# Altium footprint library PCB_CONNECTORS.PcbLib: 676 footprints (part 2 of 43)
Each footprint in its own frame and in the unit in brackets; x right, y up, seen from the top. Pads: shape width x height; smd on the part's side, far side on the other; paste and mask are expansions set on the pad; w line width, h text height; cw(c..) or ccw(c..) is an arc to the next point about the centre after c.
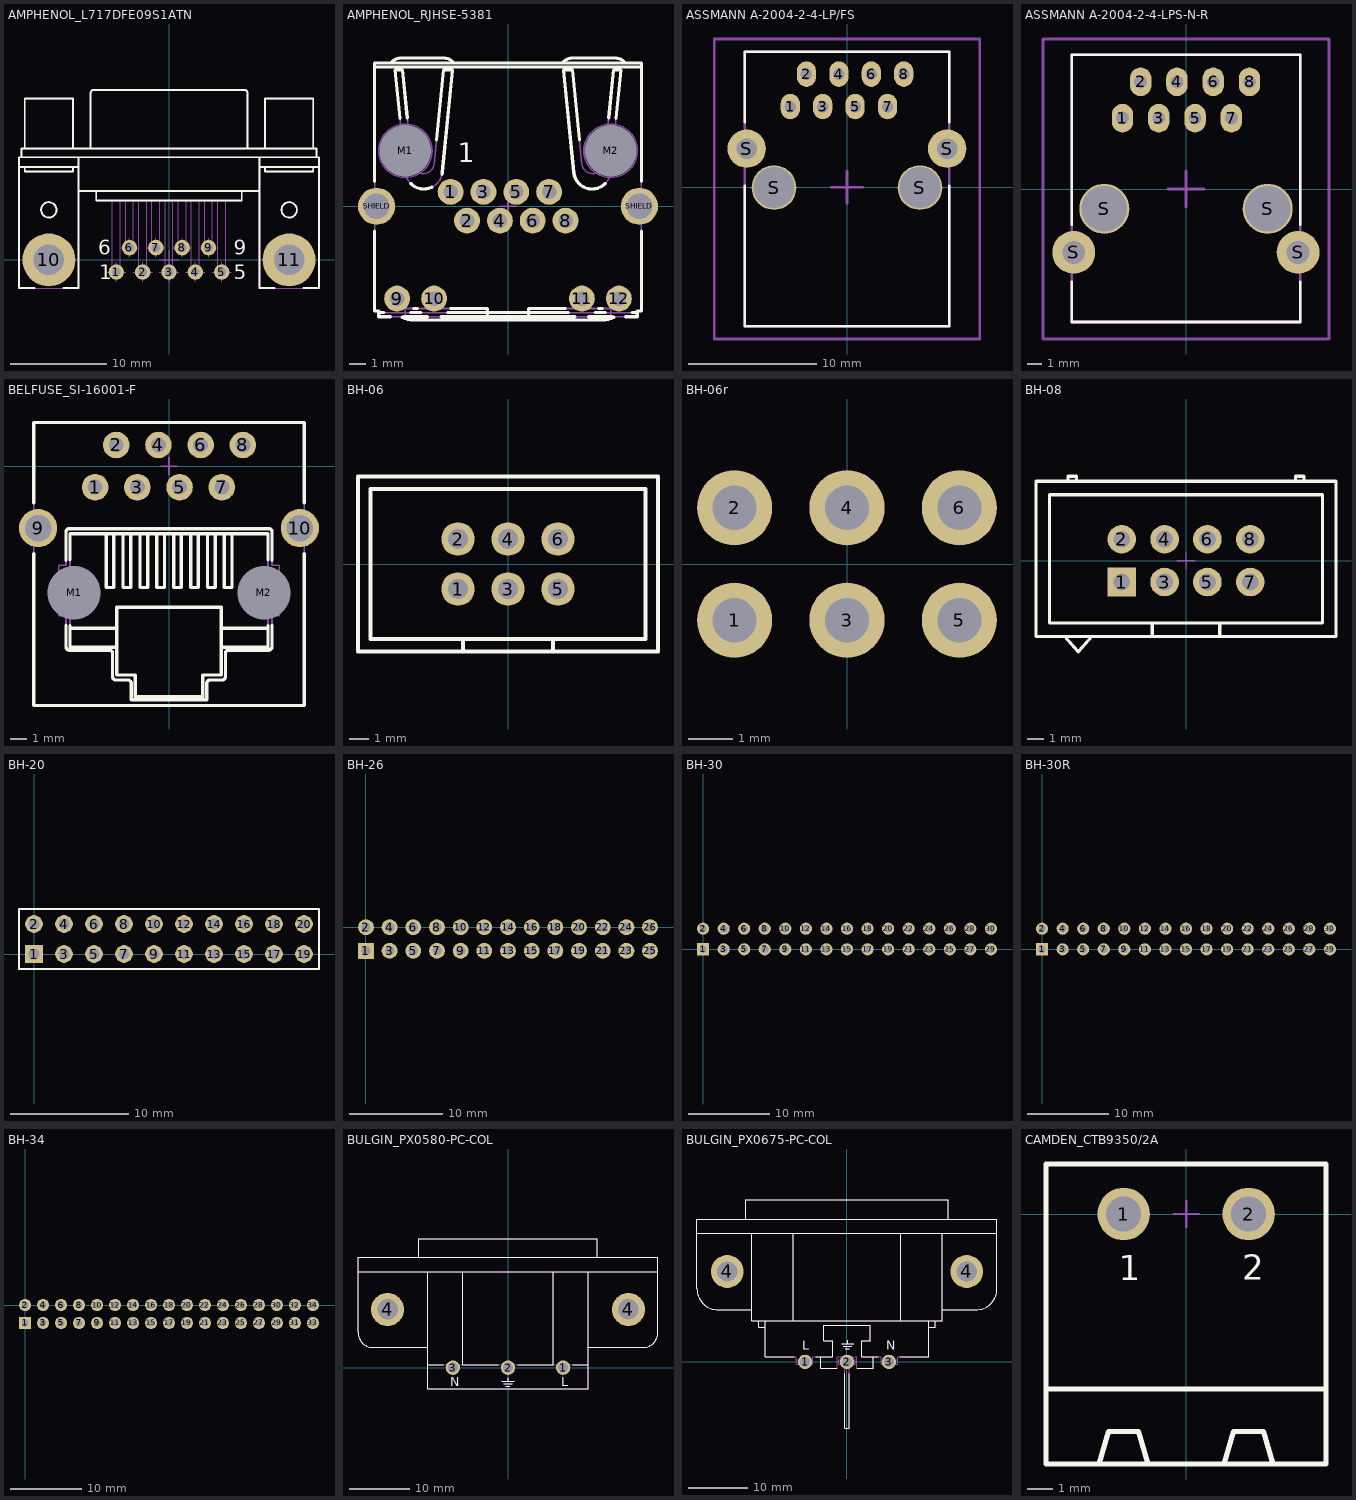
[diagram p1: the footprints below, top view; thin cyan lines are the x and y axes]

## AMPHENOL_L717DFE09S1ATN [mm] "Right Angled D-Sub 9 Female Contacts with Metal Bracket and Front Female Screwlock (UNC4-40)"
height 13.4
pads (11):
  round 1.6 hole 0.9: 1(-5.48,-1.27) 2(-2.74,-1.27) 3(0,-1.27) 4(2.74,-1.27) 5(5.48,-1.27) 6(-4.11,1.27) 7(-1.37,1.27) 8(1.37,1.27) 9(4.11,1.27)
  round 5.5 hole 3.2: 10(-12.495,0) 11(12.495,0)
Top Overlay:
  circle w0.2: c-12.5,5.2 r0.8
  circle w0.2: c12.5,5.2 r0.8
  lines w0.2: -15.35,10.67 -15.35,11.57 15.35,11.57 15.35,10.67 ; -15,9.67 -15,9.17 -10,9.17 -10,9.67 ; -15,11.57 -15,16.77 -10,16.77 -10,11.57 ; -14,-2.93 -15.6,-2.93 -15.6,10.67 15.6,10.67 15.6,-2.93 14,-2.93 ; -11,-2.93 -9.4,-2.93 -9.4,10.67 ; -9.539,9.67 -15.6,9.67 -9.4,9.67 ; -9.4,7.17 9.4,7.17 ; -8.142,11.57 -8.142,17.37 cw(c-7.842,17.37) -7.842,17.67 7.861,17.67 cw(c7.861,17.37) 8.161,17.37 8.161,11.57 ; -7.57,7.17 -7.57,6.17 7.57,6.17 7.57,7.17 ; 9.4,9.67 15.6,9.67 ; 9.4,10.67 9.4,-2.93 11,-2.93 ; 10,9.67 10,9.17 15,9.17 15,9.67 ; 10,11.57 10,16.77 15,16.77 15,11.57
  text "9" at 6.731,0.508 h1.5
  text "1" at -7.239,-2.032 h1.5
  text "5" at 6.731,-2.032 h1.5
  text "6" at -7.366,0.508 h1.5
Mechanical 8:
  lines w0.1: -13.5,0 -12.5,0 ; -12.5,-1 -12.5,0 ; -12.5,1 -12.5,0 ; -11.5,0 -12.5,0 ; -6.48,-1.27 -5.48,-1.27 ; -5.48,-2.27 -5.48,-1.27 ; -5.48,-0.27 -5.48,-1.27 ; -5.11,1.27 -4.11,1.27 ; -4.48,-1.27 -5.48,-1.27 ; -4.11,0.27 -4.11,1.27 ; -4.11,2.27 -4.11,1.27 ; -3.74,-1.27 -2.74,-1.27 ; -3.11,1.27 -4.11,1.27 ; -2.74,-2.27 -2.74,-1.27 ; -2.74,-0.27 -2.74,-1.27 ; -2.37,1.27 -1.37,1.27 ; -1.74,-1.27 -2.74,-1.27 ; -1.37,0.27 -1.37,1.27 ; -1.37,2.27 -1.37,1.27 ; -1,-1.27 0,-1.27 ; -1,0 0,0 ; -0.37,1.27 -1.37,1.27 ; 0,-2.27 0,-1.27 ; 0,-1 0,0 ; 0,-0.27 0,-1.27 ; 0,1 0,0 ; 0.37,1.27 1.37,1.27 ; 1,-1.27 0,-1.27 ; 1,0 0,0 ; 1.37,0.27 1.37,1.27 ; 1.37,2.27 1.37,1.27 ; 1.74,-1.27 2.74,-1.27 ; 2.37,1.27 1.37,1.27 ; 2.74,-2.27 2.74,-1.27 ; 2.74,-0.27 2.74,-1.27 ; 3.11,1.27 4.11,1.27 ; 3.74,-1.27 2.74,-1.27 ; 4.11,0.27 4.11,1.27 ; 4.11,2.27 4.11,1.27 ; 4.48,-1.27 5.48,-1.27 ; 5.11,1.27 4.11,1.27 ; 5.48,-2.27 5.48,-1.27 ; 5.48,-0.27 5.48,-1.27 ; 6.48,-1.27 5.48,-1.27 ; 11.5,0 12.5,0 ; 12.5,-1 12.5,0 ; 12.5,1 12.5,0 ; 13.5,0 12.5,0
Mechanical 14:
  circle w0.1: c-12.5,0 r1.6
  circle w0.1: c-12.5,5.2 r0.8
  circle w0.1: c12.5,5.2 r0.8
  circle w0.1: c12.5,0 r1.6
  lines w0.1: -15.35,10.67 -15.35,11.57 15.35,11.57 15.35,10.67 ; -15,9.67 -15,9.17 -10,9.17 -10,9.67 ; -15,11.57 -15,16.77 -10,16.77 -10,11.57 ; -9.539,9.67 -15.6,9.67 -9.4,9.67 ; -9.4,7.17 9.4,7.17 ; -9.4,10.67 -9.4,-2.93 -15.6,-2.93 -15.6,10.67 15.6,10.67 15.6,-2.93 9.4,-2.93 9.4,10.67 ; -8.142,11.57 -8.142,17.37 cw(c-7.842,17.37) -7.842,17.67 7.861,17.67 cw(c7.861,17.37) 8.161,17.37 8.161,11.57 ; -7.57,7.17 -7.57,6.17 7.57,6.17 7.57,7.17 ; -5.88,6.17 -5.88,-1.27 ccw(c-5.48,-1.27) -5.08,-1.27 -5.08,6.17 ; -4.51,6.17 -4.51,1.27 ccw(c-4.11,1.27) -3.71,1.27 -3.71,6.17 ; -3.14,6.17 -3.14,-1.27 ccw(c-2.74,-1.27) -2.34,-1.27 -2.34,6.17 ; -1.77,6.17 -1.77,1.27 ccw(c-1.37,1.27) -0.97,1.27 -0.97,6.17 ; -0.4,6.17 -0.4,-1.27 ccw(c0,-1.27) 0.4,-1.27 0.4,6.17 ; 0.97,6.17 0.97,1.27 ccw(c1.37,1.27) 1.77,1.27 1.77,6.17 ; 2.34,6.17 2.34,-1.27 ccw(c2.74,-1.27) 3.14,-1.27 3.14,6.17 ; 3.71,6.17 3.71,1.27 ccw(c4.11,1.27) 4.51,1.27 4.51,6.17 ; 5.08,6.17 5.08,-1.27 ccw(c5.48,-1.27) 5.88,-1.27 5.88,6.17 ; 9.4,9.67 15.6,9.67 ; 10,9.67 10,9.17 15,9.17 15,9.67 ; 10,11.57 10,16.77 15,16.77 15,11.57
3D body "AMPHENOL_L717DFE09S1ATN.stp": height 13.45, standoff -3.95, extent -15.6,-2.93 15.6,17.67

## AMPHENOL_RJHSE-5381 [mm] "1 Port, 8 Positions, CAT5 RJ45 Modular Connector With Yellow And Green LEDs"
height 13.46
pads (16):
  round 1.6 hole 0.9: 1(-3.554,0.886) 2(-2.538,-0.894) 3(-1.522,0.886) 4(-0.506,-0.894) 5(0.51,0.886) 6(1.526,-0.894) 7(2.542,0.886) 8(3.558,-0.894) 9(-6.862,-5.714) 10(-4.572,-5.714) 11(4.568,-5.714) 12(6.858,-5.714)
  round 1 hole 3.2 unplated mask+1.1: M1(-6.352,3.426) M2(6.348,3.426)
  round 2.3 hole 1.6: SHIELD(-8.132,-0.004) SHIELD(8.128,-0.004)
Top Overlay:
  lines w0.2: -8.257,-1.549 -8.257,-6.478 -8.003,-6.478 -8.003,-6.834 -7.293,-6.834 ; -8.257,1.541 -8.257,8.863 8.253,8.863 8.253,1.541 ; -8.257,8.609 8.253,8.609 ; -8.003,-6.58 -7.693,-6.58 ; -7.242,8.863 cw(c-6.621,8.379) -6.621,9.166 -3.979,9.166 cw(c-3.979,8.379) -3.358,8.863 ; -6.688,5.449 -6.987,8.432 -6.53,8.432 -6.233,5.473 ; -6.54,-6.87 ccw(c-5.844,-5.507) -5.844,-7.037 5.84,-7.037 ccw(c5.84,-5.507) 6.536,-6.87 ; -6.431,-6.834 -5.003,-6.834 ; -6.031,-6.58 -5.403,-6.58 ; -6.022,1.403 ccw(c-5.209,2.214) -4.719,1.176 ; -5.83,-6.326 -5.604,-6.326 ; -4.422,4.118 -3.99,8.432 -3.431,8.432 -4.066,2.1 cw(c-5.209,2.214) -4.089,1.961 ; -4.141,-6.834 4.137,-6.834 ; -3.741,-6.58 3.737,-6.58 ; -3.54,-6.326 -1.272,-6.326 -1.272,-6.834 ; 1.268,-6.834 1.268,-6.326 3.536,-6.326 ; 3.366,8.863 cw(c3.986,8.379) 3.986,9.166 6.628,9.166 cw(c6.628,8.379) 7.249,8.863 ; 4.418,4.118 3.986,8.432 3.427,8.432 4.062,2.1 ccw(c5.205,2.214) 6.018,1.403 ; 4.999,-6.834 6.427,-6.834 ; 5.399,-6.58 6.027,-6.58 ; 5.6,-6.326 5.826,-6.326 ; 6.229,5.473 6.526,8.432 6.983,8.432 6.684,5.449 ; 7.289,-6.834 7.999,-6.834 7.999,-6.478 8.253,-6.478 8.253,-1.549 ; 7.689,-6.58 7.999,-6.58
  text "1" at -3.12,2.725 h1.2
Mechanical 8:
  circle w0.1: c6.348,3.426 r1.65
  circle w0.1: c-6.352,3.426 r1.65
  circle w0.1: c8.128,-0.004 r0.8
  circle w0.1: c-8.132,-0.004 r0.8
  circle w0.1: c3.558,-0.894 r0.45
  circle w0.1: c1.526,-0.894 r0.45
  circle w0.1: c-0.506,-0.894 r0.45
  circle w0.1: c-2.538,-0.894 r0.45
  circle w0.1: c-3.554,0.886 r0.45
  circle w0.1: c-1.522,0.886 r0.45
  circle w0.1: c0.51,0.886 r0.45
  circle w0.1: c2.542,0.886 r0.45
  lines w0.1: -8.632,-0.004 -8.132,-0.004 ; -8.132,-0.504 -8.132,-0.004 ; -8.132,0.496 -8.132,-0.004 ; -7.632,-0.004 -8.132,-0.004 ; -7.362,-5.714 -6.862,-5.714 ; -6.862,-6.214 -6.862,-5.714 ; -6.862,-5.214 -6.862,-5.714 ; -6.852,3.426 -6.352,3.426 ; -6.362,-5.714 -6.862,-5.714 ; -6.352,2.926 -6.352,3.426 ; -6.352,3.926 -6.352,3.426 ; -5.852,3.426 -6.352,3.426 ; -5.072,-5.714 -4.572,-5.714 ; -4.572,-6.214 -4.572,-5.714 ; -4.572,-5.214 -4.572,-5.714 ; -4.072,-5.714 -4.572,-5.714 ; -4.054,0.886 -3.554,0.886 ; -3.554,0.386 -3.554,0.886 ; -3.554,1.386 -3.554,0.886 ; -3.054,0.886 -3.554,0.886 ; -3.038,-0.894 -2.538,-0.894 ; -2.538,-1.394 -2.538,-0.894 ; -2.538,-0.394 -2.538,-0.894 ; -2.038,-0.894 -2.538,-0.894 ; -2.022,0.886 -1.522,0.886 ; -1.522,0.386 -1.522,0.886 ; -1.522,1.386 -1.522,0.886 ; -1.022,0.886 -1.522,0.886 ; -1.006,-0.894 -0.506,-0.894 ; -0.506,-1.394 -0.506,-0.894 ; -0.506,-0.394 -0.506,-0.894 ; -0.5,0 0,0 ; -0.006,-0.894 -0.506,-0.894 ; 0,-0.5 0,0 ; 0,0.5 0,0 ; 0.01,0.886 0.51,0.886 ; 0.5,0 0,0 ; 0.51,0.386 0.51,0.886 ; 0.51,1.386 0.51,0.886 ; 1.01,0.886 0.51,0.886 ; 1.026,-0.894 1.526,-0.894 ; 1.526,-1.394 1.526,-0.894 ; 1.526,-0.394 1.526,-0.894 ; 2.026,-0.894 1.526,-0.894 ; 2.042,0.886 2.542,0.886 ; 2.542,0.386 2.542,0.886 ; 2.542,1.386 2.542,0.886 ; 3.042,0.886 2.542,0.886 ; 3.058,-0.894 3.558,-0.894 ; 3.558,-1.394 3.558,-0.894 ; 3.558,-0.394 3.558,-0.894 ; 4.058,-0.894 3.558,-0.894 ; 4.068,-5.714 4.568,-5.714 ; 4.568,-6.214 4.568,-5.714 ; 4.568,-5.214 4.568,-5.714 ; 5.068,-5.714 4.568,-5.714 ; 5.848,3.426 6.348,3.426 ; 6.348,2.926 6.348,3.426 ; 6.348,3.926 6.348,3.426 ; 6.358,-5.714 6.858,-5.714 ; 6.848,3.426 6.348,3.426 ; 6.858,-6.214 6.858,-5.714 ; 6.858,-5.214 6.858,-5.714 ; 7.358,-5.714 6.858,-5.714 ; 7.628,-0.004 8.128,-0.004 ; 8.128,-0.504 8.128,-0.004 ; 8.128,0.496 8.128,-0.004 ; 8.628,-0.004 8.128,-0.004
Mechanical 14:
  lines w0.1: -8.257,-0.408 cw(c-7.884,-0.027) -8.257,0.354 ; -8.257,8.609 8.253,8.609 ; -8.003,-6.58 7.999,-6.58 ; -7.242,8.863 cw(c-6.621,8.379) -6.621,9.166 -3.979,9.166 cw(c-3.979,8.379) -3.358,8.863 ; -6.606,-6.834 ccw(c-5.844,-5.507) -5.844,-7.037 5.84,-7.037 ccw(c5.84,-5.507) 6.602,-6.834 ; -6.352,-6.834 -6.352,-6.326 -1.272,-6.326 -1.272,-6.834 ; 1.268,-6.834 1.268,-6.326 6.348,-6.326 6.348,-6.834 ; 3.366,8.863 cw(c3.986,8.379) 3.986,9.166 6.628,9.166 cw(c6.628,8.379) 7.249,8.863 ; 8.253,-0.408 ccw(c7.88,-0.027) 8.253,0.354 ; -8.257,-6.478 -8.003,-6.478 -8.003,-6.834 7.999,-6.834 7.999,-6.478 8.253,-6.478 8.253,8.863 -8.257,8.863 -8.257,-6.478 ; -6.987,8.432 -6.352,2.1 ccw(c-5.209,2.214) -4.066,2.1 -3.431,8.432 -3.99,8.432 -4.572,2.63 cw(c-5.26,2.697) -5.948,2.63 -6.53,8.432 -6.987,8.432 ; 3.427,8.432 4.062,2.1 ccw(c5.205,2.214) 6.348,2.1 6.983,8.432 6.526,8.432 5.944,2.63 cw(c5.256,2.697) 4.568,2.63 3.986,8.432 3.427,8.432
  text "1" at -3.12,2.725 h1.2
3D body "AMPHENOL_RJHSE-5381.stp": height 15.14, standoff -3.7, extent -8.417,-7.037 8.413,9.166

## ASSMANN A-2004-2-4-LP/FS [mm]
height 13.3
pads (12):
  oval 1.5x2 hole 0.9: 1(-4.445,6.31) 2(-3.175,8.85) 3(-1.905,6.31) 4(-0.635,8.85) 5(0.635,6.31) 6(1.905,8.85) 7(3.175,6.31) 8(4.445,8.85)
  round 3 hole 1.6: S(-7.855,3.01) S(7.845,3.01)
  round 3.5 hole 3.2: S(-5.715,-0.04) S(5.715,-0.04)
Top Overlay:
  lines w0.2: -8,0.1 -8,-10.9 8,-10.9 8,0.1 ; -8,5.1 -8,10.6 8,10.6 8,5.1
Mechanical 1:
  lines w0.2: -8,-10.9 -8,10.6 8,10.6 8,-10.9 -8,-10.9
Mechanical 15:
  lines w0.2: -1.25,0 1.25,0 ; 0,-1.25 0,1.25 ; -10.4,-11.9 10.4,-11.9 10.4,11.6 -10.4,11.6 -10.4,-11.9
3D body "ASSMANN A-2004-2-4-LPFS-N-R.STEP": height 13.6, standoff -3.5, extent -8,-10.9 8,10.6

## ASSMANN A-2004-2-4-LPS-N-R [mm]
height 13.3
pads (12):
  oval 1.5x2 hole 0.9: 1(-4.445,4.96) 2(-3.175,7.5) 3(-1.905,4.96) 4(-0.635,7.5) 5(0.635,4.96) 6(1.905,7.5) 7(3.175,4.96) 8(4.445,7.5)
  round 3 hole 1.6: S(-7.855,-4.44) S(7.845,-4.44)
  round 3.5 hole 3.2: S(-5.715,-1.39) S(5.715,-1.39)
Top Overlay:
  lines w0.2: -8,-6.5 -8,-9.3 8,-9.3 8,-6.5 ; -8,-2.5 -8,9.4 8,9.4 8,-2.5
Mechanical 1:
  lines w0.2: -8,-9.3 8,-9.3 8,9.4 -8,9.4 -8,-9.3
Mechanical 15:
  lines w0.2: -1.25,0 1.25,0 ; 0,-1.25 0,1.25 ; -10,-10.5 10,-10.5 10,10.5 -10,10.5 -10,-10.5
3D body "ASSMANN A-2004-2-4-LPS-N-R.STEP": height 13.3, standoff -3.5, extent -8,-9.3 8,9.4

## BELFUSE_SI-16001-F [mm] "1 Port, Without LED, RJ45 10/100Base-T Ethernet Vertical Connector Module With Integrated Magnetics"
height 17.27
pads (12):
  round 1.6 hole 0.9: 1(-4.445,-1.27) 2(-3.175,1.27) 3(-1.905,-1.27) 4(-0.635,1.27) 5(0.635,-1.27) 6(1.905,1.27) 7(3.175,-1.27) 8(4.445,1.27)
  round 2.3 hole 1.6: 9(-7.875,-3.73) 10(7.875,-3.73)
  round 1 hole 3.2 unplated mask+1.1: M1(-5.715,-7.62) M2(5.715,-7.62)
Top Overlay:
  lines w0.2: -8.13,-5.259 -8.13,-14.4 8.13,-14.4 8.13,-5.259 ; -8.13,-2.201 -8.13,2.62 8.13,2.62 8.13,-2.201 ; -6.2,-9.56 -6.2,-10.87 ccw(c-6,-10.87) -6,-11.07 -3.595,-11.07 cw(c-3.595,-11.27) -3.395,-11.27 -3.395,-12.67 ccw(c-3.195,-12.67) -3.195,-12.87 -2.475,-12.87 cw(c-2.475,-13.07) -2.275,-13.07 -2.275,-14.05 2.275,-14.05 2.275,-13.07 cw(c2.475,-13.07) 2.475,-12.87 3.195,-12.87 ccw(c3.195,-12.67) 3.395,-12.67 3.395,-11.27 cw(c3.595,-11.27) 3.595,-11.07 6,-11.07 ccw(c6,-10.87) 6.2,-10.87 6.2,-9.56 ; -6.2,-5.68 -6.2,-3.96 cw(c-6,-3.96) -6,-3.76 6,-3.76 cw(c6,-3.96) 6.2,-3.96 6.2,-5.68 ; -5.955,-9.76 -3.15,-9.76 ; -5.955,-9.606 -5.955,-10.9 -3.15,-10.9 ; -5.955,-5.634 -5.955,-4.07 5.955,-4.07 5.955,-5.634 ; -3.78,-4.07 -3.78,-7.304 -3.32,-7.304 -3.32,-4.07 ; -2.764,-4.07 -2.764,-7.304 -2.304,-7.304 -2.304,-4.07 ; -1.748,-4.07 -1.748,-7.304 -1.288,-7.304 -1.288,-4.07 ; -0.732,-4.07 -0.732,-7.304 -0.272,-7.304 -0.272,-4.07 ; 0.284,-4.07 0.284,-7.304 0.744,-7.304 0.744,-4.07 ; 1.3,-4.07 1.3,-7.304 1.76,-7.304 1.76,-4.07 ; 2.316,-4.07 2.316,-7.304 2.776,-7.304 2.776,-4.07 ; 3.15,-10.9 5.955,-10.9 5.955,-9.606 ; 3.15,-9.76 5.955,-9.76 ; 3.332,-4.07 3.332,-7.304 3.792,-7.304 3.792,-4.07 ; -3.15,-12.57 -2.03,-12.57 -2.03,-13.87 2.03,-13.87 2.03,-12.57 3.15,-12.57 3.15,-8.49 -3.15,-8.49 -3.15,-12.57
Mechanical 8:
  lines w0.1: -8.375,-3.73 -7.875,-3.73 ; -7.875,-4.23 -7.875,-3.73 ; -7.875,-3.23 -7.875,-3.73 ; -7.375,-3.73 -7.875,-3.73 ; -6.215,-7.62 -5.715,-7.62 ; -5.715,-8.12 -5.715,-7.62 ; -5.715,-7.12 -5.715,-7.62 ; -5.215,-7.62 -5.715,-7.62 ; -4.945,-1.27 -4.445,-1.27 ; -4.445,-1.77 -4.445,-1.27 ; -4.445,-0.77 -4.445,-1.27 ; -3.945,-1.27 -4.445,-1.27 ; -3.675,1.27 -3.175,1.27 ; -3.175,0.77 -3.175,1.27 ; -3.175,1.77 -3.175,1.27 ; -2.675,1.27 -3.175,1.27 ; -2.405,-1.27 -1.905,-1.27 ; -1.905,-1.77 -1.905,-1.27 ; -1.905,-0.77 -1.905,-1.27 ; -1.405,-1.27 -1.905,-1.27 ; -1.135,1.27 -0.635,1.27 ; -0.635,0.77 -0.635,1.27 ; -0.635,1.77 -0.635,1.27 ; -0.5,0 0,0 ; -0.135,1.27 -0.635,1.27 ; 0,-0.5 0,0 ; 0,0.5 0,0 ; 0.135,-1.27 0.635,-1.27 ; 0.5,0 0,0 ; 0.635,-1.77 0.635,-1.27 ; 0.635,-0.77 0.635,-1.27 ; 1.135,-1.27 0.635,-1.27 ; 1.405,1.27 1.905,1.27 ; 1.905,0.77 1.905,1.27 ; 1.905,1.77 1.905,1.27 ; 2.405,1.27 1.905,1.27 ; 2.675,-1.27 3.175,-1.27 ; 3.175,-1.77 3.175,-1.27 ; 3.175,-0.77 3.175,-1.27 ; 3.675,-1.27 3.175,-1.27 ; 3.945,1.27 4.445,1.27 ; 4.445,0.77 4.445,1.27 ; 4.445,1.77 4.445,1.27 ; 4.945,1.27 4.445,1.27 ; 5.215,-7.62 5.715,-7.62 ; 5.715,-8.12 5.715,-7.62 ; 5.715,-7.12 5.715,-7.62 ; 6.215,-7.62 5.715,-7.62 ; 7.375,-3.73 7.875,-3.73 ; 7.875,-4.23 7.875,-3.73 ; 7.875,-3.23 7.875,-3.73 ; 8.375,-3.73 7.875,-3.73
Mechanical 14:
  lines w0.1: -6.635,-8.5 -5.449,-8.5 -5.449,-6.47 -6.635,-6.47 ; -5.955,-9.76 -3.15,-9.76 ; -5.955,-8.5 -5.955,-10.9 -3.15,-10.9 ; -5.955,-6.47 -5.955,-4.07 5.955,-4.07 5.955,-6.47 ; -3.78,-4.07 -3.78,-7.304 -3.32,-7.304 -3.32,-4.07 ; -2.764,-4.07 -2.764,-7.304 -2.304,-7.304 -2.304,-4.07 ; -1.748,-4.07 -1.748,-7.304 -1.288,-7.304 -1.288,-4.07 ; -0.732,-4.07 -0.732,-7.304 -0.272,-7.304 -0.272,-4.07 ; 0.284,-4.07 0.284,-7.304 0.744,-7.304 0.744,-4.07 ; 1.3,-4.07 1.3,-7.304 1.76,-7.304 1.76,-4.07 ; 2.316,-4.07 2.316,-7.304 2.776,-7.304 2.776,-4.07 ; 3.15,-10.9 5.955,-10.9 5.955,-8.5 ; 3.15,-9.76 5.954,-9.76 ; 3.332,-4.07 3.332,-7.304 3.792,-7.304 3.792,-4.07 ; 6.635,-8.5 5.48,-8.5 5.48,-6.47 6.635,-6.47 ; -8.13,-14.4 8.13,-14.4 8.13,2.62 -8.13,2.62 -8.13,-14.4 ; -6.635,-9.01 -6.635,-5.96 -6.2,-5.96 -6.2,-3.96 cw(c-6,-3.96) -6,-3.76 6,-3.76 cw(c6,-3.96) 6.2,-3.96 6.2,-5.96 6.635,-5.96 6.635,-9.01 6.2,-9.01 6.2,-10.87 cw(c6,-10.87) 6,-11.07 3.595,-11.07 ccw(c3.595,-11.27) 3.395,-11.27 3.395,-12.67 cw(c3.195,-12.67) 3.195,-12.87 2.475,-12.87 ccw(c2.475,-13.07) 2.275,-13.07 2.275,-14.05 -2.275,-14.05 -2.275,-13.07 ccw(c-2.475,-13.07) -2.475,-12.87 -3.195,-12.87 cw(c-3.195,-12.67) -3.395,-12.67 -3.395,-11.27 ccw(c-3.595,-11.27) -3.595,-11.07 -6,-11.07 cw(c-6,-10.87) -6.2,-10.87 -6.2,-9.01 -6.635,-9.01 ; -3.15,-12.57 -2.03,-12.57 -2.03,-13.87 2.03,-13.87 2.03,-12.57 3.15,-12.57 3.15,-8.49 -3.15,-8.49 -3.15,-12.57
3D body "BELFUSE_SI-16001-F.stp": height 17.02, standoff -4, extent -8.13,-14.4 8.13,2.62

## BH-06 [mm]
pads (6):
  round 1.7 hole 1: 1(-2.54,-1.27) 2(-2.54,1.27) 3(0,-1.27) 4(0,1.27) 5(2.54,-1.27) 6(2.54,1.27)
Top Overlay:
  lines w0.2: -2.286,-4.445 -2.286,-3.81 ; 2.286,-4.445 2.286,-3.81 ; -7.62,-4.445 7.62,-4.445 7.62,4.445 -7.62,4.445 -7.62,-4.445 ; -6.985,-3.81 6.985,-3.81 6.985,3.81 -6.985,3.81 -6.985,-3.81
Mechanical 14:
  lines w0.1: -2.286,-4.445 -2.286,-3.81 ; 2.286,-4.445 2.286,-3.81 ; -7.62,-4.445 -7.62,4.445 7.62,4.445 7.62,-4.445 -7.62,-4.445 ; -6.985,-3.81 -6.985,3.81 6.985,3.81 6.985,-3.81 -6.985,-3.81 ; -2.857,-1.651 -2.857,-1.016 -2.222,-1.016 -2.222,-1.651 -2.857,-1.651 ; -2.857,0.889 -2.222,0.889 -2.222,1.524 -2.857,1.524 -2.857,0.889 ; -0.318,-1.651 -0.318,-1.016 0.318,-1.016 0.318,-1.651 -0.318,-1.651 ; -0.318,0.889 -0.318,1.524 0.318,1.524 0.318,0.889 -0.318,0.889 ; 2.222,-1.651 2.222,-1.016 2.857,-1.016 2.857,-1.651 2.222,-1.651 ; 2.222,0.889 2.222,1.524 2.857,1.524 2.857,0.889 2.222,0.889
  text ".Comment" at -3.302,-3.556 h2
  text ".Designator" at -5.842,1.905 h2
3D body "User Library-BH_06.STEP": height 8.93, standoff -3.17, extent -7.62,-4.45 7.62,4.45

## BH-06r [mm]
pads (6):
  round 1.7 hole 1: 1(-2.54,-1.27) 2(-2.54,1.27) 3(0,-1.27) 4(0,1.27) 5(2.54,-1.27) 6(2.54,1.27)
3D body "User Library-BH_06.STEP": height 8.89, standoff -0.01, extent -7.62,0.635 7.62,12.735

## BH-08 [mm]
height 7.87
pads (8):
  rect 1.7x1.7 hole 1: 1(-3.81,-1.27)
  round 1.7 hole 1: 2(-3.81,1.27) 3(-1.27,-1.27) 4(-1.27,1.27) 5(1.27,-1.27) 6(1.27,1.27) 7(3.81,-1.27) 8(3.81,1.27)
Top Overlay:
  lines w0.2: -7.2,-4.5 -6.4,-5.4 -5.6,-4.5 ; -7.1,-4.5 -6,-4.5 ; -7,4.7 -7,5 -6.5,5 ; -6.6,5 -6.5,5 ; -6.5,4.8 -6.5,5 ; -2,-4.5 -2,-3.7 ; 2,-4.5 2,-3.7 ; 6.5,4.7 6.5,5 7,5 7,4.7 ; -8.9,-4.5 8.9,-4.5 8.9,4.7 -8.9,4.7 -8.9,-4.5 ; -8.1,-3.7 8.1,-3.7 8.1,-3.6 8.1,3.9 -8.1,3.9 -8.1,-3.7
Mechanical 8:
  lines w0.1: -4.31,-1.27 -3.81,-1.27 ; -4.31,1.27 -3.81,1.27 ; -3.81,-1.77 -3.81,-1.27 ; -3.81,-0.77 -3.81,-1.27 ; -3.81,0.77 -3.81,1.27 ; -3.81,1.77 -3.81,1.27 ; -3.31,-1.27 -3.81,-1.27 ; -3.31,1.27 -3.81,1.27 ; -1.77,-1.27 -1.27,-1.27 ; -1.77,1.27 -1.27,1.27 ; -1.27,-1.77 -1.27,-1.27 ; -1.27,-0.77 -1.27,-1.27 ; -1.27,0.77 -1.27,1.27 ; -1.27,1.77 -1.27,1.27 ; -0.77,-1.27 -1.27,-1.27 ; -0.77,1.27 -1.27,1.27 ; -0.5,0 0,0 0.5,0 ; 0.77,-1.27 1.27,-1.27 ; 0.77,1.27 1.27,1.27 ; 1.27,-1.77 1.27,-1.27 ; 1.27,-0.77 1.27,-1.27 ; 1.27,0.77 1.27,1.27 ; 1.27,1.77 1.27,1.27 ; 1.77,-1.27 1.27,-1.27 ; 1.77,1.27 1.27,1.27 ; 3.31,-1.27 3.81,-1.27 ; 3.31,1.27 3.81,1.27 ; 3.81,-1.77 3.81,-1.27 ; 3.81,-0.77 3.81,-1.27 ; 3.81,0.77 3.81,1.27 ; 3.81,1.77 3.81,1.27 ; 4.31,-1.27 3.81,-1.27 ; 4.31,1.27 3.81,1.27
Mechanical 14:
  lines w0.1: -7,4.7 -7,5 -6.5,5 -6.5,4.7 ; -2,-4.5 -2,-3.7 ; 2,-4.5 2,-3.7 ; 6.5,4.7 6.5,5 7,5 7,4.7 ; -8.9,-4.5 8.9,-4.5 8.9,4.7 -8.9,4.7 -8.9,-4.5 ; -8.1,-3.7 8.1,-3.7 8.1,3.9 -8.1,3.9 -8.1,-3.7 ; -4.128,-1.587 -3.493,-1.587 -3.493,-0.953 -4.128,-0.953 -4.128,-1.587 ; -4.128,0.953 -3.493,0.953 -3.493,1.587 -4.128,1.587 -4.128,0.953 ; -1.587,-1.587 -0.953,-1.587 -0.953,-0.953 -1.587,-0.953 -1.587,-1.587 ; -1.587,0.953 -0.953,0.953 -0.953,1.587 -1.587,1.587 -1.587,0.953 ; 0.953,-1.587 1.587,-1.587 1.587,-0.953 0.953,-0.953 0.953,-1.587 ; 0.953,0.953 1.587,0.953 1.587,1.587 0.953,1.587 0.953,0.953 ; 3.493,-1.587 4.128,-1.587 4.128,-0.953 3.493,-0.953 3.493,-1.587 ; 3.493,0.953 4.128,0.953 4.128,1.587 3.493,1.587 3.493,0.953
  text "1" at -6.1,-2.2 h3
  text ".Comment" at -8.2,-7.1 h1.5
  text ".Designator" at -6.2,5 h3
Mechanical 15:
  lines w0.05: -0.5,0 0.5,0 ; 0,-0.5 0,0.5 ; -8.9,-4.5 -8.9,4.7 8.9,4.7 8.9,-4.5 -8.9,-4.5
3D body "User Library-8 pin IDC shrouded header V2.step": height 8.98, standoff -3.17, extent -8.89,-4.5 8.89,4.7

## BH-20 [mm] "Connector; Header; 10x2 Position"
height 9
pads (20):
  rect 1.5x1.5 hole 0.9: 1(0,0)
  round 1.5 hole 0.9: 2(0,2.54) 3(2.54,0) 4(2.54,2.54) 5(5.08,0) 6(5.08,2.54) 7(7.62,0) 8(7.62,2.54) 9(10.16,0) 10(10.16,2.54) 11(12.7,0) 12(12.7,2.54) 13(15.24,0) 14(15.24,2.54) 15(17.78,0) 16(17.78,2.54) 17(20.32,0) 18(20.32,2.54) 19(22.86,0) 20(22.86,2.54)
Top Overlay:
  lines w0.2: -1.27,-1.27 -1.27,3.81 0.635,3.81 24.13,3.81 24.13,-1.27 0.635,-1.27 -1.27,-1.27
3D body "BH-20.step": height 8.75, standoff -3.1, extent -5.08,-3.105 27.94,5.995

## BH-26 [mm]
pads (26):
  rect 1.7x1.7 hole 1: 1(0,-2.54)
  round 1.7 hole 1: 2(0,0) 3(2.54,-2.54) 4(2.54,0) 5(5.08,-2.54) 6(5.08,0) 7(7.62,-2.54) 8(7.62,0) 9(10.16,-2.54) 10(10.16,0) 11(12.7,-2.54) 12(12.7,0) 13(15.24,-2.54) 14(15.24,0) 15(17.78,-2.54) 16(17.78,0) 17(20.32,-2.54) 18(20.32,0) 19(22.86,-2.54) 20(22.86,0) 21(25.4,-2.54) 22(25.4,0) 23(27.94,-2.54) 24(27.94,0) 25(30.48,-2.54) 26(30.48,0)
Mechanical 14:
  lines w0.1: -0.318,-2.857 -0.318,-2.222 0.317,-2.222 0.317,-2.857 -0.318,-2.857 ; -0.318,-0.318 -0.318,0.318 0.317,0.318 0.317,-0.318 -0.318,-0.318
3D body "70285265.stp": height 8.85, standoff -3.35, extent -5.08,-13.1 35.59,0.4

## BH-30 [mm] "Connector; Header; 15x2 Position"
height 7.5
pads (30):
  rect 1.5x1.5 hole 0.9: 1(0,0)
  round 1.5 hole 0.9: 2(0,2.54) 3(2.54,0) 4(2.54,2.54) 5(5.08,0) 6(5.08,2.54) 7(7.62,0) 8(7.62,2.54) 9(10.16,0) 10(10.16,2.54) 11(12.7,0) 12(12.7,2.54) 13(15.24,0) 14(15.24,2.54) 15(17.78,0) 16(17.78,2.54) 17(20.32,0) 18(20.32,2.54) 19(22.86,0) 20(22.86,2.54) 21(25.4,0) 22(25.4,2.54) 23(27.94,0) 24(27.94,2.54) 25(30.48,0) 26(30.48,2.54) 27(33.02,0) 28(33.02,2.54) 29(35.56,0) 30(35.56,2.54)
3D body "User Library-BH_30_V.STEP": height 8.9, standoff -3.2, extent -5.085,-3.175 40.635,5.925

## BH-30R [mm] "Connector; Header; 15x2 Position"
height 7.5
pads (30):
  rect 1.5x1.5 hole 0.9: 1(0,0)
  round 1.5 hole 0.9: 2(0,2.54) 3(2.54,0) 4(2.54,2.54) 5(5.08,0) 6(5.08,2.54) 7(7.62,0) 8(7.62,2.54) 9(10.16,0) 10(10.16,2.54) 11(12.7,0) 12(12.7,2.54) 13(15.24,0) 14(15.24,2.54) 15(17.78,0) 16(17.78,2.54) 17(20.32,0) 18(20.32,2.54) 19(22.86,0) 20(22.86,2.54) 21(25.4,0) 22(25.4,2.54) 23(27.94,0) 24(27.94,2.54) 25(30.48,0) 26(30.48,2.54) 27(33.02,0) 28(33.02,2.54) 29(35.56,0) 30(35.56,2.54)
3D body "User Library-BH_30_H.STEP": height 8.95, standoff -3.12, extent -5.08,-0.308 40.64,12.912

## BH-34 [mm]
pads (34):
  rect 1.7x1.7 hole 1: 1(0,-2.54)
  round 1.7 hole 1: 2(0,0) 3(2.54,-2.54) 4(2.54,0) 5(5.08,-2.54) 6(5.08,0) 7(7.62,-2.54) 8(7.62,0) 9(10.16,-2.54) 10(10.16,0) 11(12.7,-2.54) 12(12.7,0) 13(15.24,-2.54) 14(15.24,0) 15(17.78,-2.54) 16(17.78,0) 17(20.32,-2.54) 18(20.32,0) 19(22.86,-2.54) 20(22.86,0) 21(25.4,-2.54) 22(25.4,0) 23(27.94,-2.54) 24(27.94,0) 25(30.48,-2.54) 26(30.48,0) 27(33.02,-2.54) 28(33.02,0) 29(35.56,-2.54) 30(35.56,0) 31(38.1,-2.54) 32(38.1,0) 33(40.64,-2.54) 34(40.64,0)
Mechanical 14:
  lines w0.1: -0.318,-2.857 -0.318,-2.222 0.317,-2.222 0.317,-2.857 -0.318,-2.857 ; -0.318,-0.318 -0.318,0.318 0.317,0.318 0.317,-0.318 -0.318,-0.318
3D body "User Library-DS1013-34S (IDC-34MS CONNFLY).step": height 8.67, standoff -0.23, extent -5.17,-15.35 45.81,-2.75

## BULGIN_PX0580-PC-COL [mm] "10A 250Vac PC Flange Rear Mount Inlet IEC Connector"
height 32.1
pads (5):
  round 2.4 hole 1.7: 1(9.14,0) 2(0,0) 3(-9.14,0)
  round 5.5 hole 3.4: 4(-20,9.65) 4(20,9.65)
Top Overlay:
  lines w0.2: -24.9,15.95 24.9,15.95 ; -14.785,18.35 -14.785,21.35 14.785,21.35 14.785,18.35 ; -13.3,0.45 -10.727,0.45 ; -13.3,3.35 -22.4,3.35 cw(c-22.4,5.85) -24.9,5.85 -24.9,18.35 24.9,18.35 24.9,5.85 cw(c22.4,5.85) 22.4,3.35 13.3,3.35 ; -13.3,15.95 -13.3,-3.55 13.3,-3.55 13.3,15.95 ; -7.553,0.45 -1.587,0.45 ; -7.539,0.45 -7.539,15.95 ; -1,-2.257 1,-2.257 ; -0.7,-2.657 0.7,-2.657 ; -0.4,-3.057 0.3,-3.057 ; 0,-2.257 0,-1.657 ; 1.587,0.45 7.553,0.45 ; 7.539,0.45 7.539,15.95 ; 10.727,0.45 13.3,0.45
  text "N" at -9.602,-3.075 h1.5
  text "L" at 8.843,-3.075 h1.5
Mechanical 8:
  lines w0.1: -21,9.65 -20,9.65 ; -20,8.65 -20,9.65 ; -20,10.65 -20,9.65 ; -19,9.65 -20,9.65 ; -10.14,0 -9.14,0 ; -9.14,-1 -9.14,0 ; -9.14,1 -9.14,0 ; -8.14,0 -9.14,0 ; -1,0 0,0 ; 0,-1 0,0 ; 0,1 0,0 ; 1,0 0,0 ; 8.14,0 9.14,0 ; 9.14,-1 9.14,0 ; 9.14,1 9.14,0 ; 10.14,0 9.14,0 ; 19,9.65 20,9.65 ; 20,8.65 20,9.65 ; 20,10.65 20,9.65 ; 21,9.65 20,9.65
Mechanical 14:
  circle w0.1: c-20,9.65 r1.7
  circle w0.1: c20,9.65 r1.7
  lines w0.1: -24.9,15.95 24.9,15.95 ; -14.785,18.35 -14.785,21.35 14.785,21.35 14.785,18.35 ; -13.3,0.45 13.3,0.45 ; -13.3,3.35 -22.4,3.35 cw(c-22.4,5.85) -24.9,5.85 -24.9,18.35 24.9,18.35 24.9,5.85 cw(c22.4,5.85) 22.4,3.35 13.3,3.35 ; -13.3,15.95 -13.3,-3.55 13.3,-3.55 13.3,15.95 ; -7.539,0.45 -7.539,15.95 ; -1,-2.257 1,-2.257 ; -0.7,-2.657 0.7,-2.657 ; -0.4,-3.057 0.3,-3.057 ; 0,-2.257 0,-1.657 ; 7.539,0.45 7.539,15.95
  text "N" at -9.602,-3.075 h1.5
  text "L" at 8.843,-3.075 h1.5
3D body "BULGIN_PX0580-PC-COL.stp": height 27.8, standoff -3.6, extent -24.9,-3.55 24.9,21.35

## BULGIN_PX0675-PC-COL [mm] "10A 250Vac PC Flange Rear Mount Outlet IEC Connector"
height 30.4
pads (5):
  round 2.4 hole 1.7: 1(-7,0) 2(0,0) 3(7,0)
  round 5.5 hole 3.4: 4(-20,15.1) 4(20,15.1)
Top Overlay:
  lines w0.2: -25.05,21.5 25.05,21.5 ; -16.975,23.8 -16.95,23.825 -16.95,27.1 16.95,27.1 16.95,23.8 ; -15.9,8.7 -21.55,8.7 cw(c-21.55,12.2) -25.05,12.2 -25.05,23.8 25.05,23.8 25.05,12.2 cw(c21.55,12.2) 21.55,8.7 15.9,8.7 ; -15.9,21.5 -15.9,6.9 15.9,6.9 15.9,21.5 ; -14.775,6.9 -14.775,5.77 -13.65,5.77 ; -13.65,6.9 -13.65,0.9 -8.786,0.9 ; -5.214,0.9 -4.4,0.9 ; -1.67,-1.1 -4.4,-1.1 -4.4,0.9 ; -0.9,3 1.1,3 ; -0.6,2.6 0.8,2.6 ; -0.4,-1.96 -0.4,-11.1 0.4,-11.1 0.4,-1.96 ; -0.3,2.2 0.4,2.2 ; 0.1,3 0.1,3.6 ; 1.67,-1.1 4.4,-1.1 4.4,0.9 ; 5.214,0.9 4.4,0.9 ; 8.786,0.9 13.65,0.9 13.65,6.9 ; 9,6.9 9,21.5 ; 13.65,5.77 14.775,5.77 14.775,6.9 ; -4.4,0.9 -2.5,0.9 -2.5,3.5 -3.9,3.5 -3.9,6.1 3.9,6.1 3.9,3.5 2.5,3.5 2.5,0.9 4.4,0.9 ; -9,6.9 -9,21.5 -9,6.9
  text "N" at 6.53,2.055 h1.5
  text "L" at -7.47,2.055 h1.5
Mechanical 8:
  lines w0.1: -21,15.1 -20,15.1 ; -20,14.1 -20,15.1 ; -20,16.1 -20,15.1 ; -19,15.1 -20,15.1 ; -8,0 -7,0 ; -7,-1 -7,0 ; -7,1 -7,0 ; -6,0 -7,0 ; -1,0 0,0 ; 0,-1 0,0 ; 0,1 0,0 ; 1,0 0,0 ; 6,0 7,0 ; 7,-1 7,0 ; 7,1 7,0 ; 8,0 7,0 ; 19,15.1 20,15.1 ; 20,14.1 20,15.1 ; 20,16.1 20,15.1 ; 21,15.1 20,15.1
Mechanical 14:
  circle w0.1: c20,15.1 r1.7
  circle w0.1: c-20,15.1 r1.7
  lines w0.1: -25.05,21.5 25.05,21.5 ; -16.95,23.8 -16.95,27.1 16.95,27.1 16.95,23.8 ; -15.9,8.7 -21.55,8.7 cw(c-21.55,12.2) -25.05,12.2 -25.05,23.8 25.05,23.8 25.05,12.2 cw(c21.55,12.2) 21.55,8.7 15.9,8.7 ; -15.9,21.5 -15.9,6.9 15.9,6.9 15.9,21.5 ; -14.775,6.9 -14.775,5.77 -13.65,5.77 ; -13.65,6.9 -13.65,0.9 -8.5,0.9 -8.5,-0.4 -5.7,-0.4 -5.7,0.9 -4.4,0.9 ; -8.5,0.4 -5.7,0.4 ; -0.9,3 1.1,3 ; -0.6,2.6 0.8,2.6 ; -0.4,-0.4 -0.4,-11.1 0.4,-11.1 0.4,-0.4 ; -0.3,2.2 0.4,2.2 ; 0.1,3 0.1,3.6 ; 5.7,0.4 8.5,0.4 ; 9,6.9 9,21.5 ; 13.65,5.77 14.775,5.77 14.775,6.9 ; 13.65,6.9 13.65,0.9 8.5,0.9 8.5,-0.373 5.7,-0.373 5.7,0.9 4.4,0.9 ; -4.4,0.9 -2.5,0.9 -2.5,3.5 -3.9,3.5 -3.9,6.1 3.9,6.1 3.9,3.5 2.5,3.5 2.5,0.9 4.4,0.9 ; -4.4,0.9 -4.4,-1.1 -1.6,-1.1 -1.6,0.9 1.6,0.9 1.6,-1.1 4.4,-1.1 4.4,0.9 ; -9,6.9 -9,21.5 -9,6.9 ; -1.4,-0.4 1.4,-0.4 1.4,0.4 -1.4,0.4 -1.4,-0.4
  text "N" at 6.53,2.055 h1.5
  text "L" at -7.47,2.055 h1.5
3D body "BULGIN_PX0675-PC-COL.stp": height 30.4, standoff -3.6, extent -25.05,-11.2 25.05,27.1

## CAMDEN_CTB9350/2A [mm] "12A 380V, Pitch: 5mm, 2 Positions, Horizontal  Male Terminal Block"
height 8.3
pads (2):
  round 2.1 hole 1.4: 1(-2.5,0) 2(2.5,0)
Top Overlay:
  lines w0.2: -5.605,-7 5.595,-7 ; -3.48,-10 -3.11,-8.7 -1.9,-8.7 -1.53,-10 ; 1.52,-10 1.89,-8.7 3.1,-8.7 3.47,-10 ; -5.605,-10 5.595,-10 5.595,2 -5.605,2 -5.605,-10
  text "1" at -2.7,-2.65 h1
  text "2" at 2.24,-2.625 h1
Mechanical 8:
  lines w0.1: -3,0 -2.5,0 ; -2.54,0 -2.54,0.5 ; -2.5,-0.5 -2.5,0 ; -2.5,0.5 -2.5,0 ; -2,0 -2.5,0 ; -0.5,0 0,0 ; 0,-0.5 0,0 ; 0,0.5 0,0 ; 0.5,0 0,0 ; 2,0 2.5,0 ; 2.5,-0.5 2.5,0 ; 2.5,0.5 2.5,0 ; 3,0 2.5,0
Mechanical 14:
  lines w0.1: -5.605,-7 5.595,-7 ; -3.48,-10 -3.11,-8.7 -1.9,-8.7 -1.53,-10 ; 1.52,-10 1.89,-8.7 3.1,-8.7 3.47,-10 ; -5.605,-10 5.595,-10 5.595,2 -5.605,2 -5.605,-10
  text "1" at -2.7,-2.65 h1
  text "2" at 2.24,-2.625 h1
3D body "CAMDEN_CTB9350-2A.stp": height 8.3, standoff -3.5, extent -5.605,-10 5.595,2